# Altium schematic symbol library Hydra_Ref_sch.SCHLIB: 791 symbols (part 1 of 5) (continued)
## CK47-04100
designator C?, comment value .1uF,50V  (hidden comment: CAP;.1UF;10%;X7R;50V;CHIP;0603)
Approved: CL; NoLoad: .; MFGR: MURATA; M_PN: GRM188R71H104KA93D; G_PN: CK47-04100; level: 1; ModifyDate: 5/1/12; item_number: CK47-04100
footprint CAP-0603-N (0603 Footprint)
pins: 1, 2

## CK47-05100
designator C?, comment value 1uF,25V  (hidden comment: CAP;1UF;10%;X7R;25V;CHIP;0603)
Approved: CL; NoLoad: .; MFGR: MURATA; M_PN: GRM188R71E105KA12D; G_PN: CK47-05100; level: 1; ModifyDate: 5/1/12; item_number: CK47-05100
footprint CAP-0603-N (0603 Footprint)
pins: 1, 2

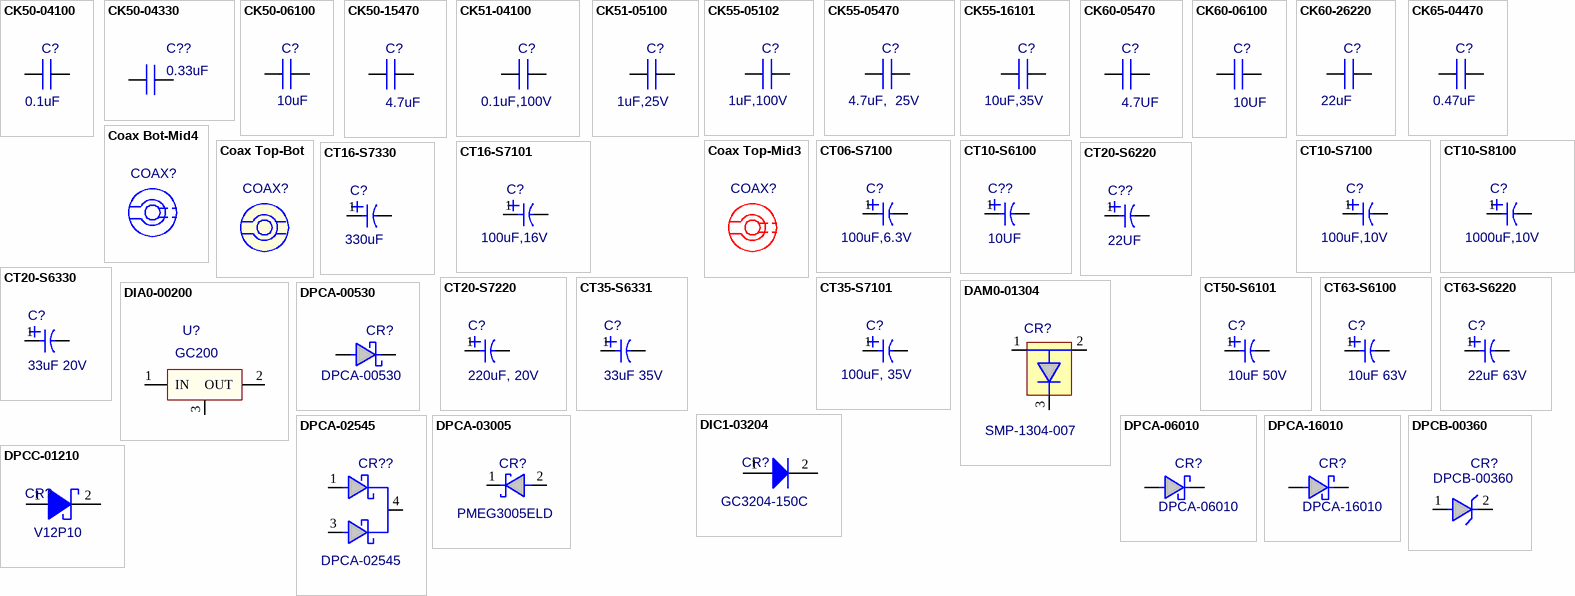
[diagram p3: symbols CK50-04100 to DPCC-01210]

## CK50-04100
designator C?, comment value 0.1uF  (hidden comment: .1UF;10%;X7R;>25V;CHIP;0805)
G_PN: CK50-04100; Approved: CL; NoLoad: .; MFGR: ANY; level: 1; ModifyDate: 02/22/12; M_PN: ANY; item_number: CK50-04100
footprint CAP-0805-N
pins: 1, 2

## CK50-04330
designator C??, comment value 0.33uF  (hidden comment: .33 UF X7R CHIP CERAMIC)
G_PN: CK50-04330; Approved: CL; NoLoad: .; MFGR: ANY; level: 1; ModifyDate: 02/26/13; M_PN: ANY; item_number: CK50-04330
footprint CAP-0805-N
pins: 1, 2

## CK50-06100
designator C?, comment value 10uF  (hidden comment: 10uF 16V X5R CHIP CERAMIC)
Approved: CL; NoLoad: .; MFGR: ANY; G_PN: CK50-06100; level: 1; ModifyDate: 4/23/13; M_PN: ANY; item_number: CK50-06100
footprint CAP-0805-N
pins: 1, 2

## CK50-15470
designator C?, comment value 4.7uF  (hidden comment: 4.7uF 25V X5R CHIP CERAMIC)
Approved: CL; NoLoad: .; MFGR: ANY; G_PN: CK50-15470; level: 1; ModifyDate: 02/26/203; M_PN: ANY; item_number: CK50-15470
footprint CAP-0805-N
pins: 1, 2

## CK51-04100
designator C?, comment value 0.1uF,100V  (hidden comment: .1UF;10%;X7R;100V;CHIP;0805)
G_PN: CK51-04100; Approved: CL; NoLoad: .; MFGR: ANY; level: 1; ModifyDate: 5/1/12; M_PN: ANY; item_number: CK51-04100
footprint CAP-0805-N
pins: 1, 2

## CK51-05100
designator C?, comment value 1uF,25V  (hidden comment: 1UF;10% MAX;X7R;25V;CERAMIC CHIP;0805)
Approved: CL; NoLoad: .; MFGR: VENKEL; M_PN: C0805X7R250-105KNE; G_PN: CK51-05100; level: 1; ModifyDate: 02/22/12; item_number: CK51-05100
footprint CAP-0805-N
pins: 1, 2

## CK55-05102
designator C?, comment value 1uF,100V  (hidden comment: 1UF;10%;X7R;100V;CERAMIC CHIP;1206)
Approved: CL; NoLoad: .; MFGR: TDK; M_PN: C3216X7R2A105KT5; G_PN: CK55-05102; level: 1; ModifyDate: 5/2/12; item_number: CK55-05102
footprint CAP-1206-N (METRIC 3225)
pins: 1, 2

## CK55-05470
designator C?, comment value 4.7uF,  25V  (hidden comment: 4.7uF;X7R;10%;CERAMIC CHIP;25V;1206)
Approved: CL; NoLoad: .; MFGR: KEMET; M_PN: C1206C475K3RACTU; G_PN: CK55-05470; level: 1; ModifyDate: 5/5/13; item_number: CK55-05470
footprint CAP-1206-N (METRIC 3225)
pins: 1, 2

## CK55-16101
designator C?, comment value 10uF,35V  (hidden comment: 10uF;X7R;CERAMIC CHIP;35V;1206)
Approved: CL; NoLoad: .; MFGR: TAIYO YUDEN; M_PN: GMK316AB7106KL-TR; G_PN: CK55-16101; level: 1; ModifyDate: 4/30/13; item_number: CK55-16101
footprint CAP-1206-N (METRIC 3225)
pins: 1, 2

## CK60-05470
designator C?, comment 4.7UF
4.7uF;X5R;CERAMIC CHIP;25V;1210; Approved: CL; NoLoad: .; MFGR: AVX; M_PN: 12103D475KAT2A; G_PN: CK60-05470; level: 1; ModifyDate: 4/29/13; Value: 4.7UF; item_number: CK60-05470
footprint CAP-1210-N (METRIC 3225)
pins: 1, 2

## CK60-06100
designator C?, comment 10UF
10uF 10% X7R CERAMIC 16V 1210 CHIP; Approved: XiaoXiao; NoLoad: .; MFGR: ANY; G_PN: CK60-06100; level: 1; ModifyDate: 10/04/2012; M_PN: ANY; Value: 10UF; item_number: CK60-06100
footprint CAP-1210-N (METRIC 3225)
pins: 1, 2

## CK60-26220
designator C?, comment value 22uF  (hidden comment: 22uF;X5R;CERAMIC CHIP;25V;1210)
G_PN: CK60-26220; Approved: CL; NoLoad: .; MFGR: ANY; level: 1; ModifyDate: 3/23/13; M_PN: ANY; item_number: CK60-26220
footprint CAP-1210-N (METRIC 3225)
pins: 1, 2

## CK65-04470
designator C?, comment value 0.47uF  (hidden comment: .47UF;20%;Z5U;50V;CERAMIC CHIP;1812)
G_PN: CK65-04470; Approved: CL; NoLoad: .; MFGR: ANY; level: 1; ModifyDate: 02/22/12; M_PN: ANY; item_number: CK65-04470
footprint CAP-1812-N
pins: 1, 2

## Coax Bot-Mid4
designator COAX?  (no BOM)
Coax Bot-Mid4; level: 1; NoLoad: N/L
footprint Coax Bot-Mid4 (PCB Coaxial Transition)
footprint Coax_Bot-Mid4

## Coax Top-Bot
designator COAX?  (no BOM)
Coax Top-Bot; level: 1; NoLoad: N/L
footprint Coax Top-Bot (Footprint not found)
footprint Coax_Top-Bot

## Coax Top-Mid3
designator COAX?  (no BOM)
Coax Top-Mid3; level: 1; NoLoad: N/L
footprint Coax Top-Mid3 (Footprint not found)
footprint Coax_Top-Mid3

## CT06-S7100
designator C?, comment value 100uF,6.3V  (hidden comment: 100UF;20%;6.3V;.04 ESR;POLY TANT;3528)
G_PN: CT06-S7100; Approved: CL; NoLoad: .; MFGR: Kemet; M_PN: T520B107M006ATE040; level: 1; ModifyDate: 3/11/14; item_number: CT06-S7100
footprint CAPP-3528-21-N (BsizePolarized Cap 3528-21 EIA Code)
pins: 1 POS, 2 NEG

## CT10-S6100
designator C??, comment 10UF
10 UF;10%;10V;3.4 OHM ESR;3216; Approved: XiaoXiao; NoLoad: .; MFGR: ANY; G_PN: CT10-S6100; level: 1; ModifyDate: 12/03/2012; M_PN: ANY; Value: 10UF; item_number: CT10-S6100
footprint CAPP-3216-18 (EIA 3216-18)
pins: 1 POS, 2 NEG

## CT10-S7100
designator C?, comment value 100uF,10V  (hidden comment: 100UF;20%;10V;LOW ESR;7343 D SIZE)
G_PN: CT10-S7100; Approved: CL; NoLoad: .; MFGR: AVX; M_PN: TPSD107DK010R0100; level: 1; ModifyDate: 5/7/12; item_number: CT10-S7100
footprint CAPP-7343-31-N (DsizePolarized Cap 7343-31 EIA Code)
pins: 1 POS, 2 NEG

## CT10-S8100
designator C?, comment value 1000uF,10V  (hidden comment: 1000UF;10%;10V;TANTALUM;.12 OHM ESR;SMD 2924)
G_PN: CT10-S8100; Approved: CL; NoLoad: .; MFGR: VISHAY; M_PN: 597D108X9010F2T; level: 1; ModifyDate: 09/21/12; item_number: CT10-S8100
footprint CAPP-597D-F CASE (TANT CHIP CAP .299x.238x.201 F CASE CODE VISHAY)
footprint CAPP-597D-F_CASE
pins: 1 POS, 2 NEG

## CT16-S7101
designator C?, comment value 100uF,16V  (hidden comment: 100 UF;20%;16V;LOW ESR;7343 E SIZE)
G_PN: CT16-S7101; Approved: CL; NoLoad: .; MFGR: AVX; M_PN: TAJE107K016R; level: 1; ModifyDate: 4/11/12; item_number: CT16-S7101
footprint CAPP-7343-43-N (EsizePolarized Cap 7343-43 EIA Code)
pins: 1 POS, 2 NEG

## CT16-S7330
designator C?, comment value 330uF  (hidden comment: 330uF; 20%; 16V; TANTALUM; .236W x .238L; SMT)
M_PN: 594D337X9016R2T; G_PN: CT16-S7330; MFGR: VISHAY/DALE; NoLoad: .; Approved: CL; level: 1; ModifyDate: 02/22/12; item_number: CT16-S7330
footprint CAPP-594D-R CASE (TANT CHIP CAP .283x.235x.148 R CASE CODE VISHAY)
footprint CAPP-594D-R_CASE
pins: 1 POS, 2 NEG

## CT20-S6220
designator C??, comment 22UF
22UF;10%;20V;EIA 7343;SMT; Approved: XiaoXiao; NoLoad: .; MFGR: ANY; G_PN: CT20-S6220; level: 1; ModifyDate: 12/03/2012; M_PN: ANY; Value: 22UF; item_number: CT20-S6220
footprint CAPP-7343-31-N (DsizePolarized Cap 7343-31 EIA Code)
pins: 1 POS, 2 NEG

## CT20-S6330
designator C?, comment value 33uF 20V  (hidden comment: 33UF 20V TANTALUM SMT, 7343-31)
G_PN: CT20-S6330; Approved: CL; NoLoad: .; MFGR: ANY; level: 1; ModifyDate: 02/22/12; M_PN: ANY; item_number: CT20-S6330
footprint CAPP-7343-31-N (DsizePolarized Cap 7343-31 EIA Code)
pins: 1 POS, 2 NEG

## CT20-S7220
designator C?, comment value 220uF, 20V  (hidden comment: 220UF;10%;20V;TANTALUM;.08 OHM ESR;3024)
G_PN: CT20-S7220; Approved: CL; NoLoad: .; MFGR: ANY; level: 1; ModifyDate: 5/23/12; M_PN: ANY; item_number: CT20-S7220
footprint CAPP-597D-R CASE (TANT CHIP CAP .299x.238x.160" R CASE CODE VISHAY)
footprint CAPP-597D-R_CASE
pins: 1 POS, 2 NEG

## CT35-S6331
designator C?, comment value 33uF 35V  (hidden comment: 33 UF;20%;35V;.07 OHM ESR;7343-31)
G_PN: CT35-S6331; Approved: CL; NoLoad: .; MFGR: VISHAY; M_PN: TCJD336M035R0070; level: 1; ModifyDate: 4/30/12; item_number: CT35-S6331
footprint CAPP-7343-31-N (DsizePolarized Cap 7343-31 EIA Code)
pins: 1 POS, 2 NEG

## CT35-S7101
designator C?, comment value 100uF, 35V  (hidden comment: 100 UF 35V TANTALUM .1 OHM ESR SMD F)
G_PN: CT35-S7101; Approved: CL; NoLoad: .; MFGR: VISHAY; M_PN: 597D107X0035F2T; level: 1; ModifyDate: 5/2/13; item_number: CT35-S7101
footprint CAPP-597D-F CASE (TANT CHIP CAP .299x.238x.201 F CASE CODE VISHAY)
footprint CAPP-597D-F_CASE
pins: 1 POS, 2 NEG

## CT50-S6101
designator C?, comment value 10uF 50V  (hidden comment: 10 UF;20%;50V;.3 OHM;7343)
G_PN: CT50-S6101; Approved: CL; NoLoad: .; MFGR: ANY; level: 1; ModifyDate: 5/16/12; M_PN: ANY; item_number: CT50-S6101
footprint CAPP-7343-43-N (EsizePolarized Cap 7343-43 EIA Code)
pins: 1 POS, 2 NEG

## CT63-S6100
designator C?, comment value 10uF 63V  (hidden comment: 10 UF;20%;63V;.1 OHM ESR;POLYMER:7343-43)
G_PN: CT63-S6100; Approved: CL; NoLoad: .; MFGR: VISHAY; M_PN: TCJE106M063R0100; level: 1; ModifyDate: 4/30/12; item_number: CT63-S6100
footprint CAPP-7343-43-N (EsizePolarized Cap 7343-43 EIA Code -E)
pins: 1 POS, 2 NEG

## CT63-S6220
designator C?, comment value 22uF 63V  (hidden comment: 22UF; 10%; 63V; .238W X .299L X .185; SMT)
G_PN: CT63-S6220; Approved: CL; NoLoad: .; MFGR: VISHAY; M_PN: 597D226X9063F2T; level: 1; ModifyDate: 4/30/12; item_number: CT63-S6220
footprint CAPP-597D-F CASE (TANT CHIP CAP .299x.238x.201 F CASE CODE VISHAY)
footprint CAPP-597D-F_CASE
pins: 1 POS, 2 NEG

## DAM0-01304
designator CR?, comment M_PN: SMP-1304-007  (hidden comment: DIODE;PIN;7 OHMS/10MA;0.3PF;SOT-23)
Value: SMP-1304-007; NoLoad: .; MFGR: SKYWORKS; Approved: CL; G_PN: DAM0-01304; level: 1; ModifyDate: 9/21/12; item_number: DAM0-01304
footprint SOT23-N (.95mm PITCH 1.3mmW 2.9mmL 1.1mmH)
pins: 1 K, 2 A, 3 A

## DIA0-00200
designator U?, comment M_PN: GC200  (hidden comment: DIODE;SRD;COAXIAL;200MHz COM GEN)
G_PN: DIA0-00200; Approved: NM; NoLoad: .; MFGR: HEROTEK; level: 1; ModifyDate: 1/23/2013; item_number: DIA0-00200
footprint DIO-GC-OUTLINE-L (STEP RECOVERY DIODE COMB GENERATOR)
pins: 1 IN, 2 OUT, 3 GND

## DIC1-03204
designator CR?, comment M_PN: GC3204-150C  (hidden comment: DIODE; STEP RECOVERY; VBR=80V; TL=200NS; TT=650PS)
G_PN: DIC1-03204; Value: GC3204-150C; Approved: CL; NoLoad: .; MFGR: MICRO SEMI; level: 1; ModifyDate: 4/12/12; item_number: DIC1-03204
footprint VRCTR-150C (VARACTOR .100L .050W .50H)
pins: 1 A, 2 K

## DPCA-00530
designator CR?
RECTIFIER;5A;30VPK;.43HVF;SCHOT;SOD-123; Value: {Value}; M_PN: MBR0530T1; NoLoad: .; Approved: NM; level: 1; MFGR: *; ModifyDate: 11/06/12; G_PN: DPCA-00530; item_number: DPCA-00530
footprint SOD-123
pins: 1 A, 2 C

## DPCA-02545
designator CR??
IFIER;30A;45V-PK;SCHOTTKY;VF .57V;D2PAK; Value: MBRB2545CTT4G; NoLoad: .; Approved: CL; MFGR: ON SEMI; level: 1; M_PN: MBRB2545CTT4G; ModifyDate: 5/6/13; G_PN: DPCA-02545; item_number: DPCA-02545
footprint D2PAK_ON_SEMI (Footprint not found)
pins: 1 A, 3 A, 4 C

## DPCA-03005
designator CR?, comment M_PN: PMEG3005ELD  (hidden comment: RECTIFIER DIODE; SCHOTTKY;.3V@100MA; 40PF;  SOD882D)
Value: PMEG3005ELD; NoLoad: .; MFGR: NXP; Approved: CL; G_PN: DPCA-03005; level: 1; ModifyDate: 3/6/12; item_number: DPCA-03005
footprint SOD-882D-N (8mm Pitch, 1.05L,0.65W,0.4H (mm))
pins: 1 K, 2 A

## DPCA-06010
designator CR?, comment G_PN: DPCA-06010  (hidden comment: RECTIFIER;1A;60V-PK;SCHOTTKY;SOD128 PKG;VF .46V)
Value: PMEG6010EP,115; NoLoad: .; Approved: CL; MFGR: NXP; level: 1; M_PN: PMEG6010EP,115; ModifyDate: 4/30/13; item_number: DPCA-06010
footprint SOD128_NXP (Footprint not found)
pins: 1 A, 2 C

## DPCA-16010
designator CR?, comment G_PN: DPCA-16010  (hidden comment: RECTIFIER;1A;60V-PK;SCHOTTKY;SOD123W PKG;VF .46V)
Value: PMEG6010ER,115; NoLoad: .; Approved: CL; MFGR: NXP; level: 1; M_PN: PMEG6010ER,115; ModifyDate: 4/30/13; item_number: DPCA-16010
footprint SOD123W_NXP (Footprint not found)
pins: 1 A, 2 C

## DPCB-00360
designator CR?, comment G_PN: DPCB-00360  (hidden comment: RECTIFIER;3A;60VPK;.74VF@3A;SCHOT;SMC)
M_PN: MBRS360T3G; MFGR: ON-SEMI; NoLoad: .; Approved: CL; Value: MBRS360T3G; level: 1; ModifyDate: 4/29/13; item_number: DPCB-00360
footprint SMC_ON SEMI (SMC PLASTIC PACKAGE CASE 403-03 270X230X84(mil))
footprint SMC_ON_SEMI
pins: 1 A, 2 hidden, 2 A

## DPCC-01210
designator CR?, comment M_PN: V12P10  (hidden comment: RECTIFIER;12A;100V;VF=0.5V@5A;SCHOTTKEY;TO-277A)
G_PN: DPCC-01210; Value: V12P10; Approved: NM; NoLoad: .; MFGR: VISHAY; level: 1; ModifyDate: 10/24/12; item_number: DPCC-01210
footprint TO-277A (TO-277a (SMPC) VISHAY)
pins: 1 A, 2 K

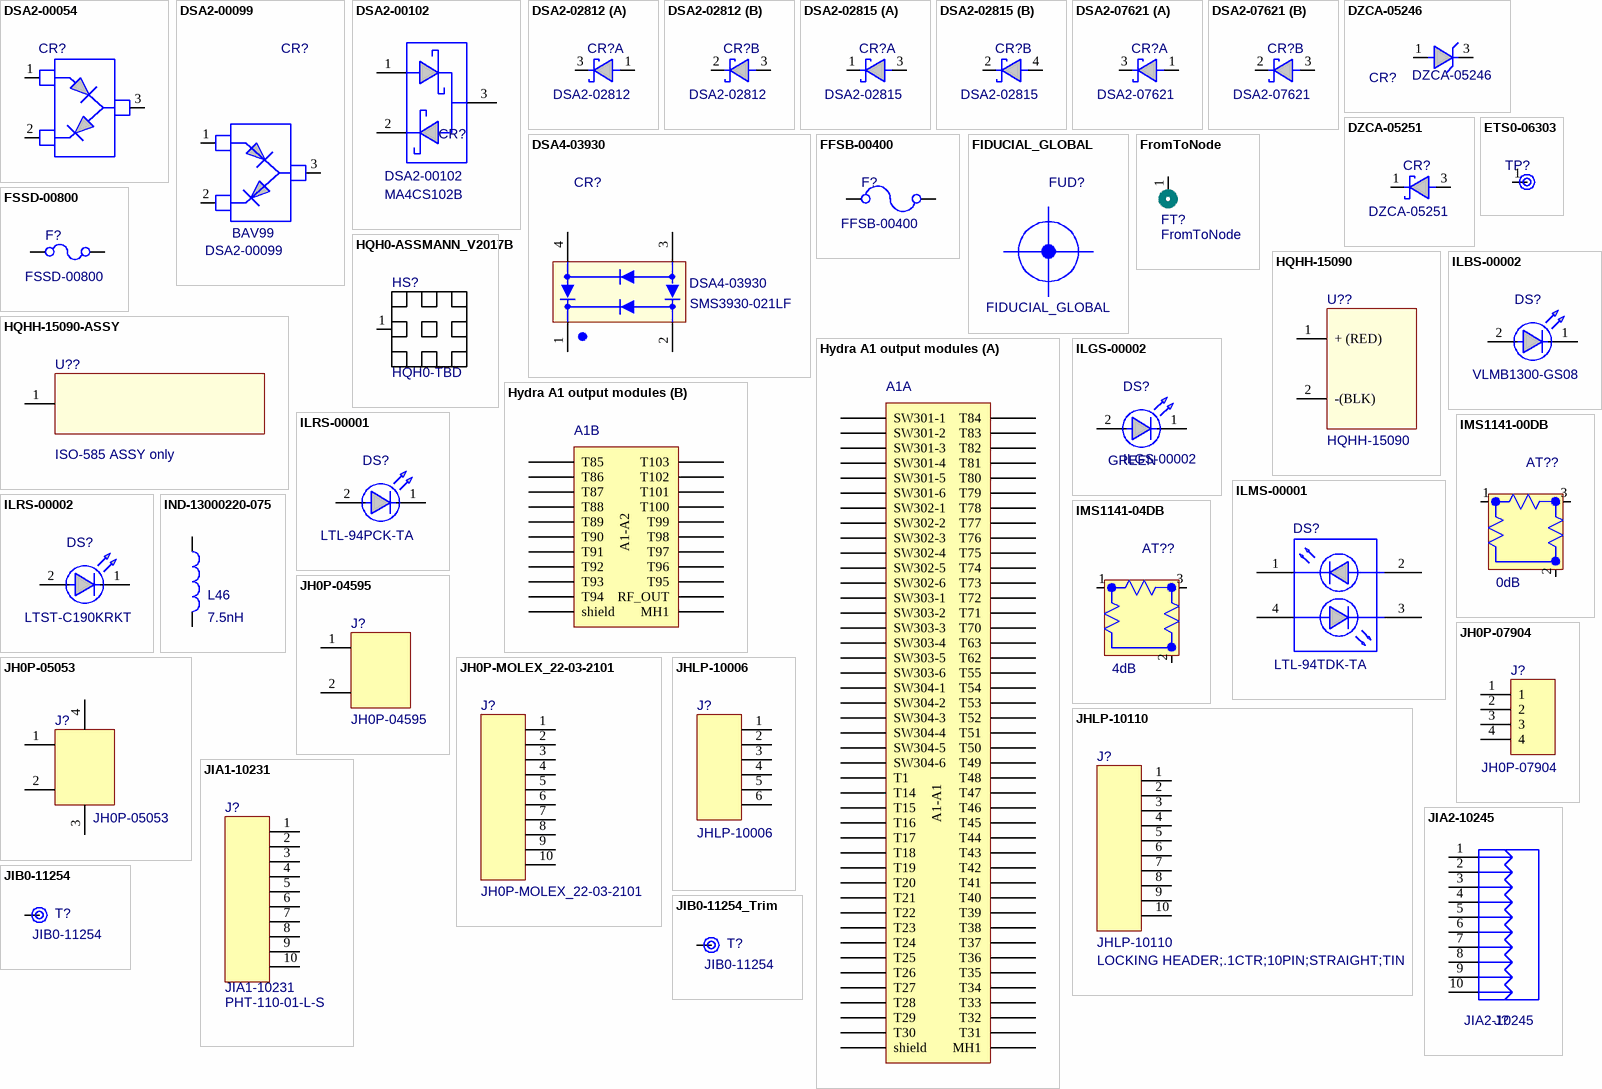
[diagram p4: symbols DSA2-00054 to JIB0-11254_Trim]

## DSA2-00054
designator CR?, comment Diode;Dual;Schottky;.4VF@10MA;5NS;SOT23  (value not drawn)
G_PN: DSA2-00054; MFGR: NXP; M_PN: BAT54S; NoLoad: .; Approved: CL; Value: BAT54S; level: 1; ModifyDate: 2/26/13; item_number: DSA2-00054
footprint SOT23-N (.95mm PITCH 1.3mmW 2.9mmL 1.1mmH)
pins: 1 a1, 2 k2, 3 k1,a2

## DSA2-00099
designator CR?, comment BAV99
DSA2-00099; MFGR: FAIRCHILD; NoLoad: .; Approved: NB; level: 1; M_PN: BAV99; ModifyDate: 10/23/2006 12:19:45; Value: BAV99; G_PN: DSA2-00099; item_number: DSA2-00099
footprint SOT23-N (.95mm PITCH 1.3mmW 2.9mmL 1.1mmH)
pins: 1 ANODE, 2 CATHODE, 3 COMMON

## DSA2-00102
designator CR?, comment M_PN: MA4CS102B  G_PN: DSA2-00102  (hidden comment: DUAL DIODE;SCHOTTKY;.5V@10MA;1PF;SOT-23)
Value: MA4CS102B; NoLoad: .; Approved: CL; MFGR: M/A-COM; level: 1; ModifyDate: 4/2/12; item_number: DSA2-00102
footprint SOT23-N (.95mm PITCH 1.3mmW 2.9mmL 1.1mmH)
pins: 1 Anode, 2 Cathode, 3 Common

## DSA2-02812
designator CR?
DUAL RF DIODE; SCHOTTKY;.4V@1MA; 1.2PF; SOT-23; NoLoad: .; MFGR: AVAGO; Approved: CL; level: 1; Value: HSMS-2812; M_PN: HSMS-2812; ModifyDate: 3/6/12; G_PN: DSA2-02812; item_number: DSA2-02812
footprint SOT23-N (.95mm PITCH 1.3mmW 2.9mmL 1.1mmH)
part A pins: 1 A, 3 K
part B pins: 2 K, 3 A

## DSA2-02815
designator CR?, comment G_PN: DSA2-02815  (hidden comment: DUAL RF DIODE;SCHOTTKY;.4V@1MA;1.2PF;SOT-23)
NoLoad: .; Approved: CL; level: 1; M_PN: HSMS-2815; ModifyDate: 3/14/12; item_number: DSA2-02815
footprint SOT143-Avago (1.9mm PITCH 1.3mmW 2.3mmL 1.1mmH -4pins)
part A pins: 1 K, 3 A
part B pins: 2 K, 4 A

## DSA2-07621
designator CR?, comment G_PN: DSA2-07621  (hidden comment: DUAL RF DIODE; SCHOTTKY; .32V@1MA; .25PF; SOT-23)
Value: SMS7621-005LF; NoLoad: .; MFGR: SKYWORKS; Approved: CL; level: 1; M_PN: SMS7621-005LF; ModifyDate: 7/1/14; item_number: DSA2-07621
footprint SOT23-N (.95mm PITCH 1.3mmW 2.9mmL 1.1mmH)
part A pins: 1 A, 3 K
part B pins: 2 K, 3 A

## DSA4-03930
designator CR?, comment M_PN: SMS3930-021LF  G_PN: DSA4-03930  (hidden comment: DIODE;BRIDGE;SCH;MED BARRIER;0.5PF;0.37VF@1MA;SOT-143)
MFGR: SKYWORKS; NoLoad: .; Approved: CL; Value: SMS3930-021LF; level: 1; ModifyDate: 4/23/12; item_number: DSA4-03930
footprint SOT143-Avago (1.9mm PITCH 1.3mmW 2.3mmL 1.1mmH -4pins)
pins: 1, 2, 3, 4

## DZCA-05246
designator CR?
Description; M_PN: MMBZ5250BLT1; MFGR: ON-Semiconductor; NoLoad: .; Approved: {Approved}; Value: MMBZ5246BLT1; level: 1; ModifyDate: 07/14/2006 16:27:37; G_PN: DZCA-05246; item_number: DZCA-05246
footprint SOT23-N (.95mm PITCH 1.3mmW 2.9mmL 1.1mmH)
pins: 1 A, 2 hidden, 3 C

## DZCA-05251
designator CR?, comment G_PN: DZCA-05251  (hidden comment: 5.1V;5%;.15W;Z=20;0603)
Value: CZRU52C5V1; NoLoad: .; Approved: CL; level: 1; M_PN: 5.1V;5%;.15W;Z=20;0603; ModifyDate: 01/08/14; item_number: DZCA-05251
footprint DO-0603-SOD-523F (Metric 1608)
pins: 1 K, 3 A

## ETS0-06303
designator TP?, comment TEST TERMINAL;CHIP TYPE;SMT;063 X.031 X.045  (value not drawn)
Value: RCUCTE; MFGR: KOA; NoLoad: .; Approved: CL; G_PN: ETS0-06303; level: 1; M_PN: RCUCTE; ModifyDate: 5/24/12; item_number: ETS0-06303
footprint TP-RCU (0603 size test point -KOA)
pins: 1

## FFSB-00400
designator F?, comment G_PN: FFSB-00400  (hidden comment: FUSE;4A;125V;FB;.29L X .17W X .12H;SMT)
MFGR: BUSSMAN; NoLoad: .; Approved: CL; M_PN: TR/SFT4; level: 1; ModifyDate: 5/3/12; item_number: FFSB-00400
footprint FUSE-7543-135-N (7.5L 4.3W 3.11H mm)
pins: 1, 2

## FIDUCIAL_GLOBAL
designator FUD?  (no BOM)
NoLoad: N/L; level: 1; Value: *
footprint FIDUCIAL_GLOBAL
pins: 1 hidden

## FromToNode
designator FT?  (net tie, no BOM)
NoLoad: N/L; level: 1; Approved: *; G_PN: *; MFGR: *; Value: *
footprint FromToNode_Top
footprint FromToNode_ML1
footprint FromToNode_ML2
footprint FromToNode_ML3
footprint FromToNode_ML4
footprint FromToNode_ML5
footprint FromToNode_ML6
footprint FromToNode_Bottom
pins: 1

## FSSD-00800
designator F?, comment G_PN: FSSD-00800  (hidden comment: FUSE;8A;72V;SB;.0088 OHMS;SMT 2410)
MFGR: LITTELFUSE; NoLoad: .; Approved: CL; M_PN: 0452008.MRL; Value: 0452008.MRL; level: 1; ModifyDate: 5/2/13; item_number: FSSD-00800
footprint FUSE-2410 (FUSE, Littelfuse SMT 2410, Body 6.10x2.69mm, IPC Medium Density)
pins: 1, 2

## HQH0-ASSMANN_V2017B
designator HS?  G_PN: HQH0-TBD
HEATSINK;SMT;10WX10LX7H(MM); M_PN: V2017B; MFGR: ASSMANN; NoLoad: .; level: 1; ModifyDate: 8/27/13; item_number: HQH0-TBD
footprint HQH0-ASSMANN_V2017B (HEATSINK;SMT;10WX10LX7H(MM))
pins: 1

## HQHH-15090
designator U??, comment G_PN: HQHH-15090  (hidden comment: OVEN;MINIATURE;60 DEG C;15V;9 W;.930 SQ.X.23H)
Value: ISO-585; MFGR: ISOTEMP; NoLoad: .; Approved: CL; level: 1; M_PN: ISO-585; ModifyDate: 6/8/12; item_number: HQHH-15090
footprint ISO-585 pads (only 2 PADS FOR ISO-585)
footprint ISO-585_pads
pins: 1 + (RED), 2 -(BLK)

## HQHH-15090-ASSY
designator U??, comment ISO-585 ASSY only
Outline of the part only - OVEN;MINIATURE;60 DEG C;15V;9 W;.930 SQ.X.23H; MFGR: ISOTEMP; NoLoad: N/L; Approved: CL; level: 1; Value: ISO-585; ModifyDate: 6/8/12; M_PN: ISO-585 ASSY only
footprint ISO-585 ASSY (ISO-585 Outline ONLY, connected to the pads with TWO wires)
footprint ISO-585_ASSY
pins: 1

## Hydra A1 output modules
designator A1, comment PCB features  (value not drawn)  (no BOM)
Hydra A1 output modules (PCB features); G_PN: 35123-35127; NoLoad: .; level: 1; Approved: *; MFGR: *; Value: *; item_number: 35123-35127
footprint Hydra A1 output modules (Hydra A1 output modules (pad expansions/locations, mechanical features))
footprint Hydra_A1_output_modules
part A pins: A1-A1_shield shield, MH1, SW301-1, SW301-2, SW301-3, SW301-4, SW301-5, SW301-6, SW302-1, SW302-2, SW302-3, SW302-4, SW302-5, SW302-6, SW303-1, SW303-2, SW303-3, SW303-4, SW303-5, SW303-6, SW304-1, SW304-2, SW304-3, SW304-4, SW304-5, SW304-6, T1, T14, T15, T16, T17, T18, T19, T20, T21, T22, T23, T24, T25, T26, T27, T28, T29, T30, T31, T32, T33, T34, T35, T36, T37, T38, T39, T40, T41, T42, T43, T44, T45, T46, T47, T48, T49, T50, T51, T52, T53, T54, T55, T62, T63, T70, T71, T72, T73, T74, T75, T76, T77, T78, T79, T80, T81, T82, T83, T84
part B pins: A1-A2_shield shield, MH1, MH_RF_OUT RF_OUT, T85, T86, T87, T88, T89, T90, T91, T92, T93, T94, T95, T96, T97, T98, T99, T100, T101, T102, T103
part A text: A1-A1
part B text: A1-A2

## ILBS-00002
designator DS?, comment value VLMB1300-GS08  (hidden comment: LED;BLUE;54 MCD;20MA;1.6X0.8MM;0603;ROHS)
MFGR: VISHAY; G_PN: ILBS-00002; NoLoad: .; Approved: CL; level: 1; M_PN: VLMB1300-GS08; ModifyDate: 7/10/12; item_number: ILBS-00002
footprint LED-LTST-C190KRKT (LITE-ON ELECTRONIC)
footprint LED-LTST-C190KRKT - WITH RA LIGHT PIPE (LED with G_PN ILLP-00101 and M_PN SLP3-150-250-R, RIGHT ANGLE LIGHT PIPE .25 LONG EMITTER)
pins: 1 C, 2 A

## ILGS-00002
designator DS?  value GREEN
MFGR: INFINEON; M_PN: LGT67OK; NoLoad: .; Approved: CL; level: 1; G_PN: ILGS-00002; ModifyDate: 4/12/12; item_number: ILGS-00002
footprint LED-LGT670 (old part)
pins: 1 C, 2 A

## ILMS-00001
designator DS?, comment M_PN: LTL-94TDK-TA  (hidden comment: LED;DUAL;YEL/GRN;6.3MCD MIN;3X3.4;SMT)
Value: LTL-94TDK-TA; G_PN: ILMS-00001; NoLoad: .; Approved: CL; MFGR: LITE ON; level: 1; ModifyDate: 4/25/12; item_number: ILMS-00001
footprint LED-ILMS0001 (old part does not have a big pads as suggested in data sheet)
pins: 1 C, 2 A, 3 C, 4 A

## ILRS-00001
designator DS?, comment value LTL-94PCK-TA  (hidden comment: LED; RED; 6.3 MCD. MIN; 3X3.4MM; P-LCC-2)
MFGR: LITE_ON; G_PN: ILRS-00001; NoLoad: .; Approved: NB; level: 1; M_PN: LTL-94PCK-TA; ModifyDate: 08/02/2006 08:30:36; item_number: ILRS-00001
footprint LED-LITE_ON-RED
pins: 1 C, 2 A

## ILRS-00002
designator DS?, comment value LTST-C190KRKT  (hidden comment: LED;RED;54 MCD;20MA;1.6X0.8MM;0603;ROHS)
MFGR: LITE_ON; G_PN: ILRS-00002; NoLoad: .; Approved: CL; level: 1; M_PN: LTST-C190KRKT; ModifyDate: 7/3/12; item_number: ILRS-00002
footprint LED-LTST-C190KRKT - WITH RA LIGHT PIPE (LED with G_PN ILLP-00101 and M_PN SLP3-150-250-R, RIGHT ANGLE LIGHT PIPE .25 LONG EMITTER)
footprint LED-LTST-C190KRKT (LITE-ON ELECTRONIC)
footprint LED-LTST-C190KRKT_WITH_RA_LIGHT_PIPE
pins: 1 C, 2 A

## IMS1141-00DB
designator AT??, comment value 0dB  (hidden comment: PAD;CHIP;0dB;+/-.3dB;.08 x .05;50 OHM;FACE DOWN)
NoLoad: .; Approved: CL; M_PN: IMS1141-00DB; MFGR: IMS RESISTORS; G_PN: MPFC-A1001; level: 1; ModifyDate: 4/16/13; item_number: MPFC-A1001
footprint ATTN-IMS-0805 (Footprint not found)
pins: 1 IN/OUT, 2 GND (power), 3 IN/OUT

## IMS1141-04DB
designator AT??, comment value 4dB  (hidden comment: PAD;CHIP;4dB;+/-.3dB;0805)
NoLoad: .; Approved: CL; M_PN: IMS1141-02DB; MFGR: IMS RESISTORS; G_PN: TBD; level: 1; item_number: TBD
footprint ATTN-IMS-0805 (Footprint not found)
pins: 1 IN/OUT, 2 GND (power), 3 IN/OUT

## IND-13000220-075
designator L46, comment value 7.5nH  (hidden comment: 13000220-075)
7.5nH,0402CS; MFGR: Coilcraft; NoLoad: .; Approved: XiaoXiao; M_PN: 0402CS-7N5XGLU; level: 1; ModifyDate: 03/08/2010; G_PN: 13000220-075; item_number: 13000220-075
footprint IND-0402CS (Coilcraft 0402CS SM Inductor 47X25X26)
pins: 1, 2

## JH0P-04595
designator J?, comment G_PN: JH0P-04595  (hidden comment: HEADER; 1MM CTR; 2 PIN; STRAIGHT; SMT)
M_PN: 1734595-2; Value: 1734595-2; Approved: CL; NoLoad: .; MFGR: TE CONNECTIVITY; level: 1; ModifyDate: 5/14/12; item_number: JH0P-04595
footprint CONN-1734595-2
pins: 1, 2

## JH0P-05053
designator J?, comment G_PN: JH0P-05053  (hidden comment: HEADER; 3MM CTR; 2 PIN; STRAIGHT; SMT)
M_PN: 2-1445053-2; Value: 2-1445053-2; Approved: CL; NoLoad: .; MFGR: TE CONNECTIVITY; level: 1; ModifyDate: 5/14/12; item_number: JH0P-05053
footprint 2-1445053-2 (Footprint not found)
pins: 1, 2, 3 GND, 4 GND

## JH0P-07904
designator J?, comment G_PN: JH0P-07904  (hidden comment: HEADER; 2MM CTR; 4 PIN; STRAIGHT; SMT)
M_PN: TMM-102-06-L-D-SM; Value: JH0P-07904; Approved: CL; NoLoad: .; MFGR: SAMTEC; level: 1; ModifyDate: 3/13/12; item_number: JH0P-07904
footprint JH0P-07904
pins: 1, 2, 3, 4

## JH0P-MOLEX_22-03-2101
designator J?, comment G_PN: JH0P-MOLEX_22-03-2101  (hidden comment: LOCKING HEADER;.1CTR;10PIN;STRAIGHT;TIN)
NoLoad: .; MFGR: MOLEX; level: 1; ModifyDate: 08/02/2013; M_PN: 22-03-2101; item_number: JH0P-MOLEX_22-03-2101
footprint CONN-JH0P-MOLEX_22-03-2101 (HEADER;.1CTR;10PIN;STRAIGHT;TIN)
pins: 1, 2, 3, 4, 5, 6, 7, 8, 9, 10

## JHLP-10006
designator J?  G_PN: JHLP-10006
LOCKING HEADER;.1CNTR;6PIN STR; Approved: FV; NoLoad: .; MFGR: AMP; M_PN: 641126-6; level: 1; ModifyDate: 07/23/2013; item_number: JHLP-10006
footprint CONN-JHLP-10006 (CONN-JHLP-10110)
pins: 1, 2, 3, 4, 5, 6

## JHLP-10110
designator J?, comment LOCKING HEADER;.1CTR;10PIN;STRAIGHT;TIN  G_PN: JHLP-10110
Approved: ZY; NoLoad: .; MFGR: ITW PANCON; M_PN: MLSS100-10-C; level: 1; ModifyDate: 07/03/2013; item_number: JHLP-10110
footprint CONN-JHLP-10110
pins: 1, 2, 3, 4, 5, 6, 7, 8, 9, 10

## JIA1-10231
designator J?  M_PN: PHT-110-01-L-S  G_PN: JIA1-10231
STRIPLINE PLUG;.1 CTR;10 PIN;SINGLE ROW;.230;PRESS FIT;GOLD; NoLoad: .; MFGR: SAMTEC; level: 1; ModifyDate: 08/14/2013; item_number: JIA1-10231
footprint CONN-JH0P-SAMTEC-PHT-110-01-L-S (HEADER;.1CTR;10PIN;STRAIGHT;PRESS FIT;GOLD)
pins: 1, 2, 3, 4, 5, 6, 7, 8, 9, 10

## JIA2-10245
designator J?, comment G_PN: JIA2-10245  (hidden comment: HEADER;1MM CTR;2 X 5 PIN;STR;SMT)
Value: M40-3200545R; MFGR: HARWIN; Approved: CL; NoLoad: .; level: 1; M_PN: M40-3200545R; ModifyDate: 5/24/12; item_number: JIA2-10245
footprint HEADER20_100X100_JIA2-20250()
footprint M40-3200545R (Footprint not found)
pins: 1, 2, 3, 4, 5, 6, 7, 8, 9, 10

## JIB0-11254
designator T?  G_PN: JIB0-11254
SOCKET;SINGLE;.018-.040 ID X .254;OPEN;GLD; M_PN: 380635; MFGR: AMP; NoLoad: .; level: 1; ModifyDate: 11/30/12; item_number: JIB0-11254
footprint TP-380635-125 (AMP SOCKET 89H150P Height on top side 0.035 and 0.220 on opposite side, 125mil pad)
pins: 1

## JIB0-11254_Trim
designator T?  G_PN: JIB0-11254
SOCKET;SINGLE;.018-.040 ID X .254;OPEN;GLD; M_PN: 380635; MFGR: AMP; NoLoad: .; level: 1; ModifyDate: 11/30/12; item_number: JIB0-11254
footprint TP-380635-125-TRIM (AMP SOCKET 89H150P Height on top side 0.035 and 0.220 on opposite side, 125mil pad)
pins: 1

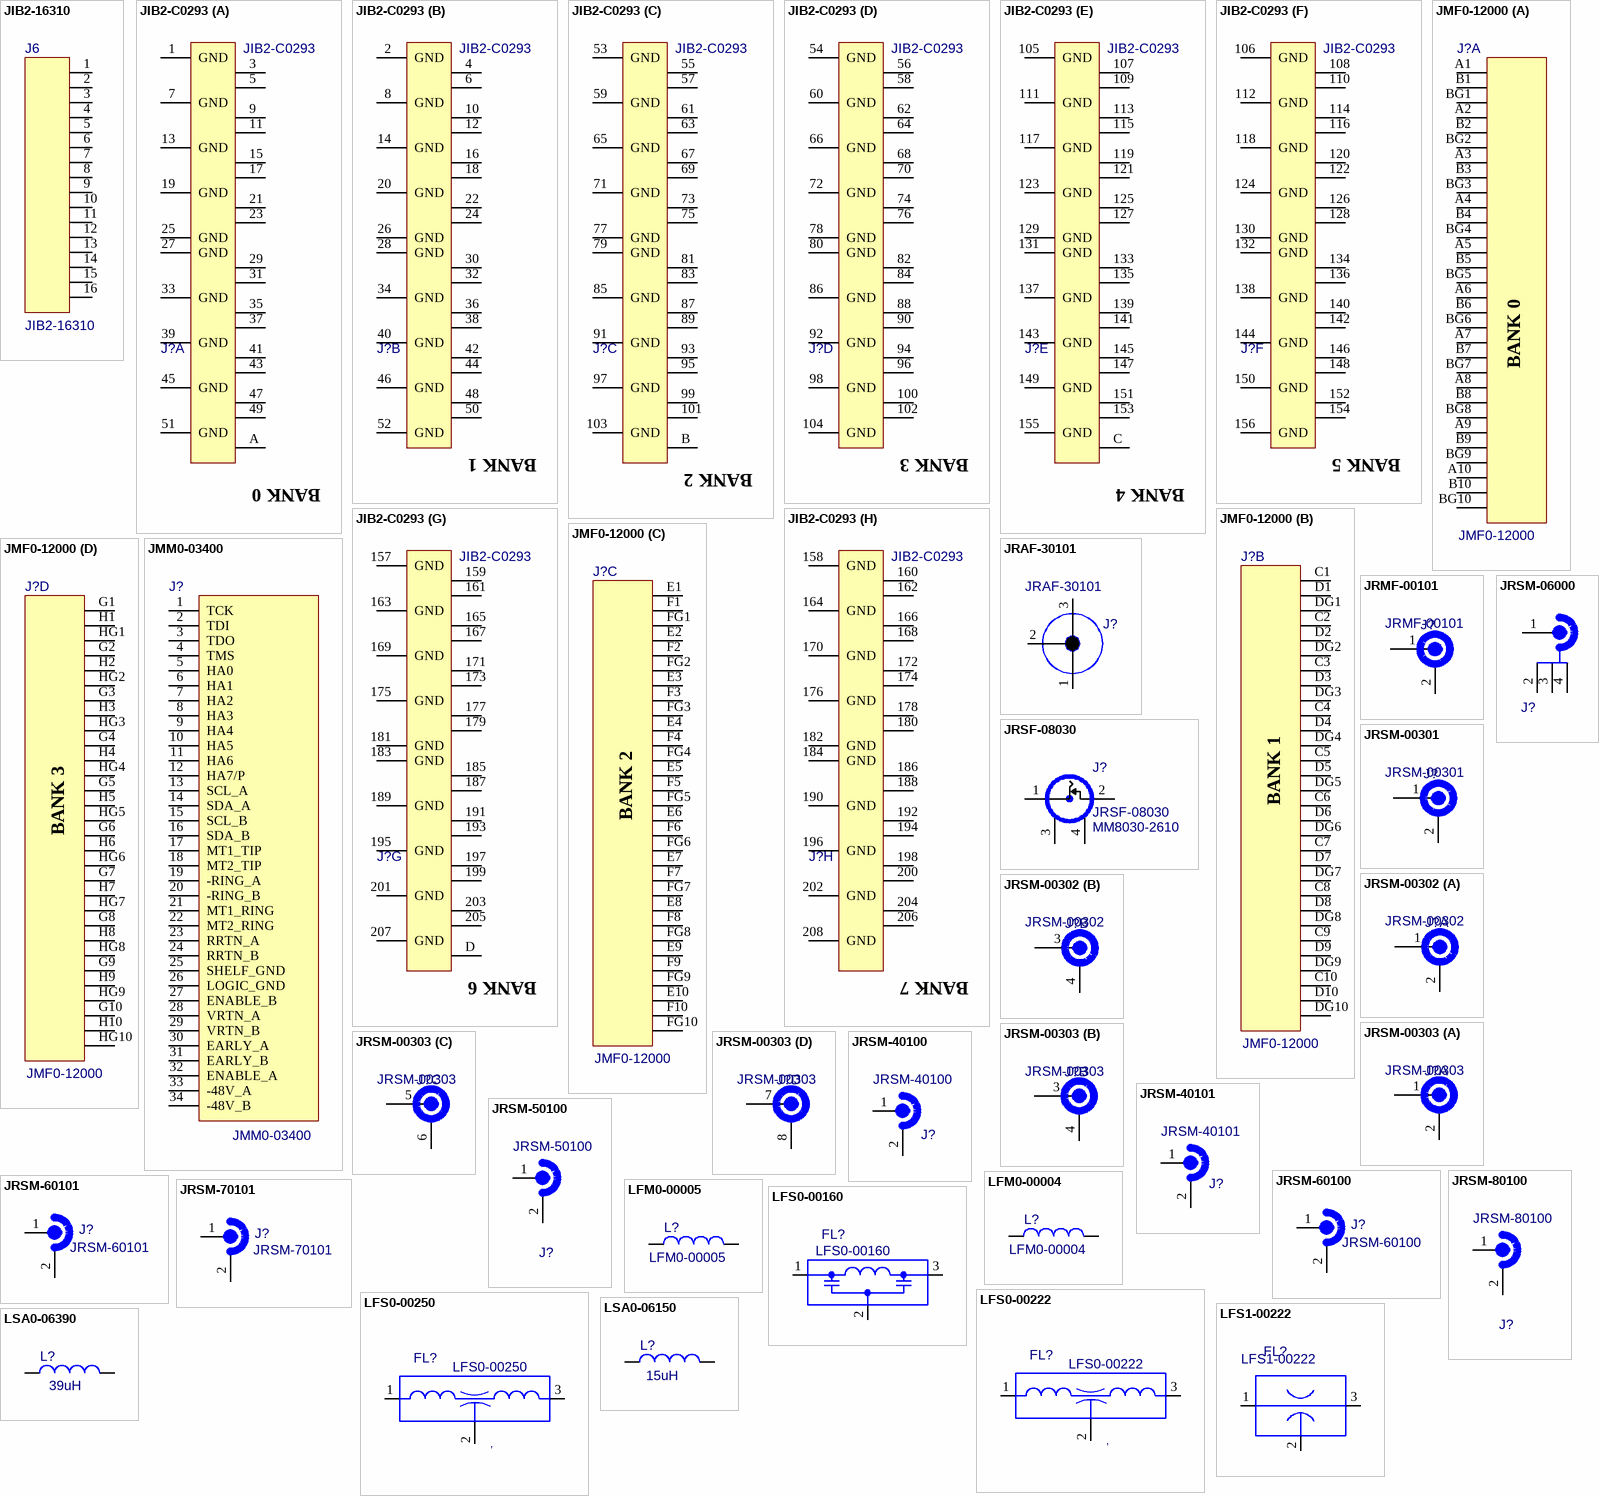
[diagram p5: symbols JIB2-16310 to LSA0-06390]

## JIB2-16310
designator J6  G_PN: JIB2-16310
STRIPLINE SOCKET;2MM CTR;2X8 PIN;.31" HT; M_PN: ESQT-108-03-G-D-310; Approved: NM; NoLoad: .; MFGR: SAMTEC; level: 1; line_number: 500; ModifyDate: 12/05/12; item_number: JIB2-16310
footprint CONN_ESQT-108-03-G-D-310 (SAMTEC-STRIPLINE SOCKET;2MM CTR;2X8 PIN;.31" HT)
pins: 1, 2, 3, 4, 5, 6, 7, 8, 9, 10, 11, 12, 13, 14, 15, 16

## JIB2-C0293
designator J?
STRIPLINE SOCKET;.025CTR;4 BANKS OF 16 DIFF PAIR W/GND PLANE;SMT; NoLoad: .; Approved: Vitoria; MFGR: Samtec; M_PN: QFSS-064-04.25-L-D-DP-A; level: 1; G_PN: JIB2-C0293; item_number: JIB2-C0293
footprint CONN-Samtec-QFSS-064-04.25-L-D-DP-A
part A pins: 1 GND, 3, 5, 7 GND, 9, 11, 13 GND, 15, 17, 19 GND, 21, 23, 25 GND, 27 GND, 29, 31, 33 GND, 35, 37, 39 GND, 41, 43, 45 GND, 47, 49, 51 GND, A
part B pins: 2 GND, 4, 6, 8 GND, 10, 12, 14 GND, 16, 18, 20 GND, 22, 24, 26 GND, 28 GND, 30, 32, 34 GND, 36, 38, 40 GND, 42, 44, 46 GND, 48, 50, 52 GND
part C pins: 53 GND, 55, 57, 59 GND, 61, 63, 65 GND, 67, 69, 71 GND, 73, 75, 77 GND, 79 GND, 81, 83, 85 GND, 87, 89, 91 GND, 93, 95, 97 GND, 99, 101, 103 GND, B
part D pins: 54 GND, 56, 58, 60 GND, 62, 64, 66 GND, 68, 70, 72 GND, 74, 76, 78 GND, 80 GND, 82, 84, 86 GND, 88, 90, 92 GND, 94, 96, 98 GND, 100, 102, 104 GND
part E pins: 105 GND, 107, 109, 111 GND, 113, 115, 117 GND, 119, 121, 123 GND, 125, 127, 129 GND, 131 GND, 133, 135, 137 GND, 139, 141, 143 GND, 145, 147, 149 GND, 151, 153, 155 GND, C
part F pins: 106 GND, 108, 110, 112 GND, 114, 116, 118 GND, 120, 122, 124 GND, 126, 128, 130 GND, 132 GND, 134, 136, 138 GND, 140, 142, 144 GND, 146, 148, 150 GND, 152, 154, 156 GND
part G pins: 157 GND, 159, 161, 163 GND, 165, 167, 169 GND, 171, 173, 175 GND, 177, 179, 181 GND, 183 GND, 185, 187, 189 GND, 191, 193, 195 GND, 197, 199, 201 GND, 203, 205, 207 GND, D
part H pins: 158 GND, 160, 162, 164 GND, 166, 168, 170 GND, 172, 174, 176 GND, 178, 180, 182 GND, 184 GND, 186, 188, 190 GND, 192, 194, 196 GND, 198, 200, 202 GND, 204, 206, 208 GND
part A text: BANK 0
part B text: BANK 1
part C text: BANK 2
part D text: BANK 3
part E text: BANK 4
part F text: BANK 5
part G text: BANK 6
part H text: BANK 7